# Altium footprint library 7Robot.PcbLib: 64 footprints (part 3 of 4)
Each footprint in its own frame and in the unit in brackets; x right, y up, seen from the top. Pads: shape width x height; smd on the part's side, far side on the other; paste and mask are expansions set on the pad; w line width, h text height; cw(c..) or ccw(c..) is an arc to the next point about the centre after c.
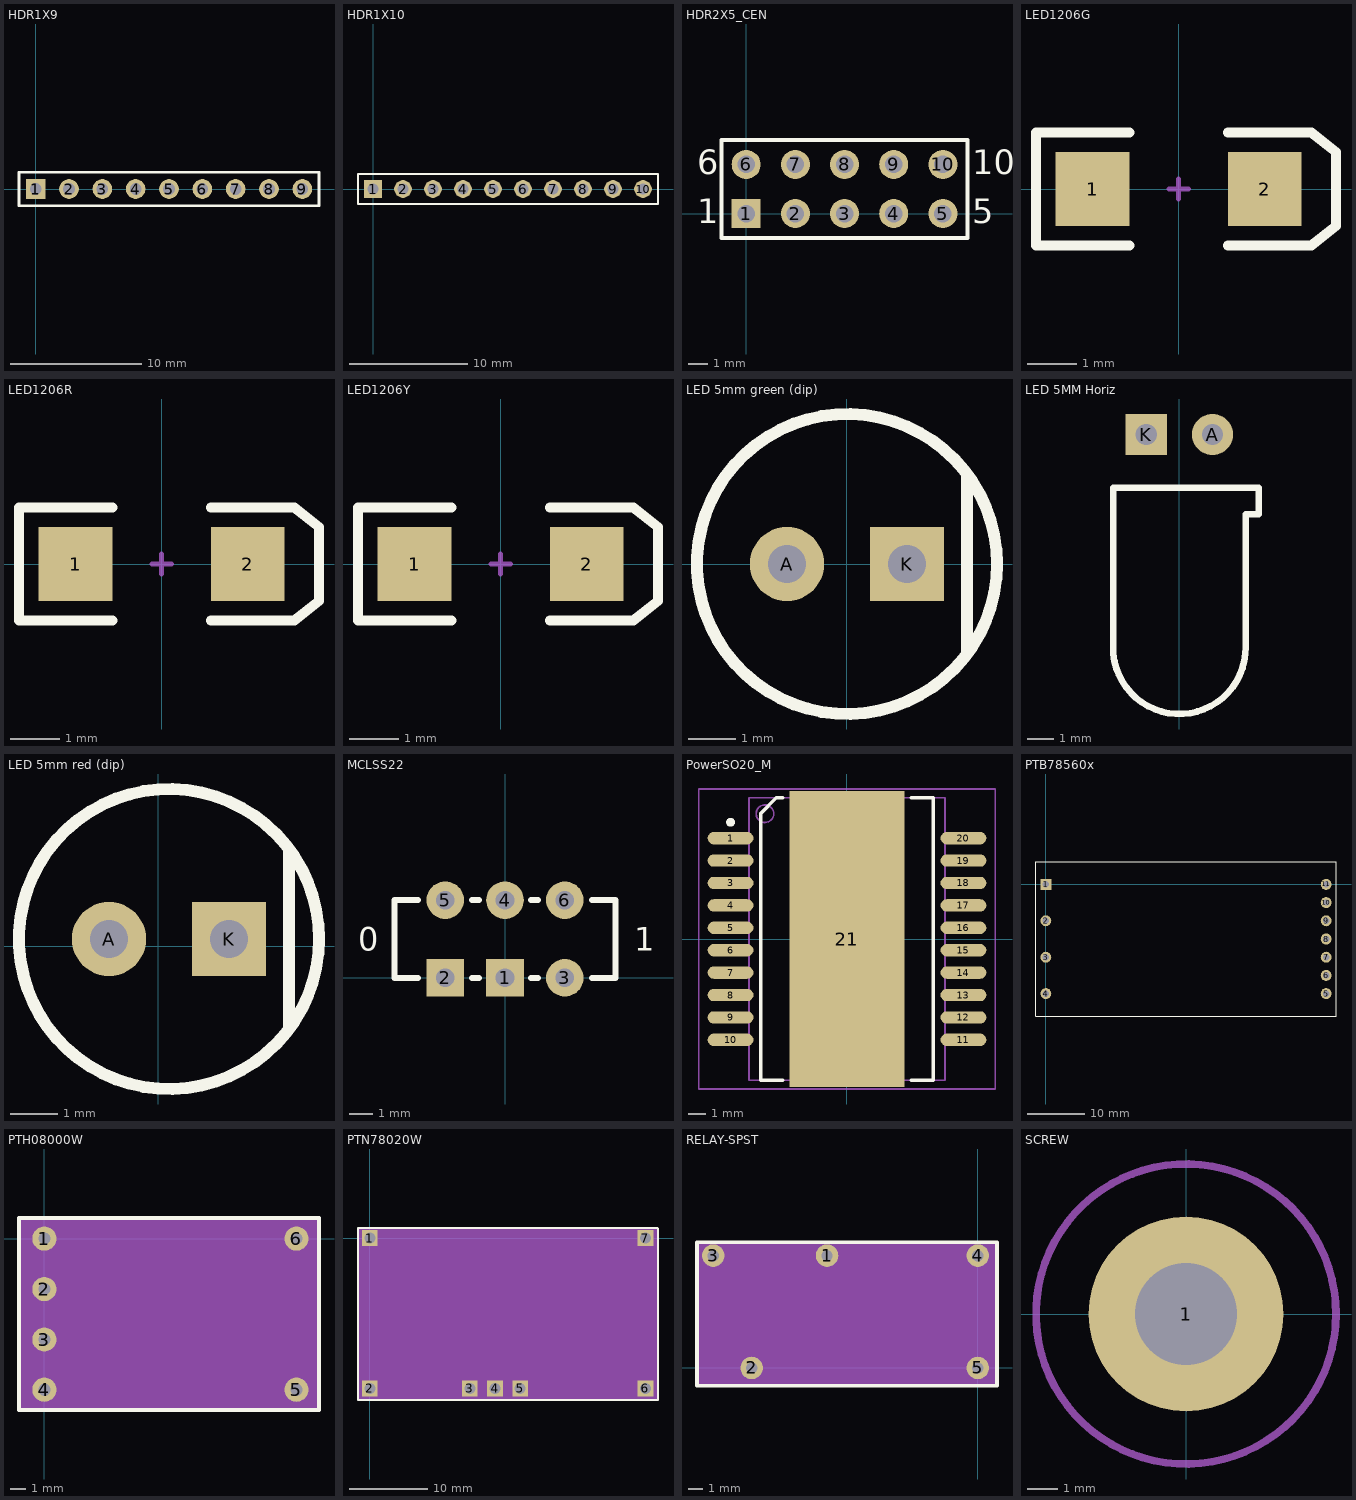
[diagram p2: the footprints below, top view; thin cyan lines are the x and y axes]

## HDR1X9 [mm] "Connector; Header; 9 Position"
pads (9):
  rect 1.5x1.5 hole 0.9: 1(0,0)
  round 1.5 hole 0.9: 2(2.54,0) 3(5.08,0) 4(7.62,0) 5(10.16,0) 6(12.7,0) 7(15.24,0) 8(17.78,0) 9(20.32,0)
Top Overlay:
  lines w0.2: -1.27,-1.27 -1.27,1.27 21.59,1.27 21.59,-1.27 -1.27,-1.27
3D body: height 8.2, standoff -3, extent -1.17,-1.246 21.69,1.253

## HDR1X10 [mm] "Connector; Header; 10 Position"
pads (10):
  rect 1.5x1.5 hole 0.9: 1(0,0)
  round 1.5 hole 0.9: 2(2.54,0) 3(5.08,0) 4(7.62,0) 5(10.16,0) 6(12.7,0) 7(15.24,0) 8(17.78,0) 9(20.32,0) 10(22.86,0)
Top Overlay:
  lines w0.2: -1.27,-1.27 24.13,-1.27 24.13,1.27 0.635,1.27 -1.27,1.27 -1.27,-1.27
3D body: height 8.2, standoff -3, extent -1.17,-1.246 24.23,1.253

## HDR2X5_CEN [mm] "Connector; Header; 5x2 Position"
pads (10):
  rect 1.5x1.5 hole 0.9: 1(0,0)
  round 1.5 hole 0.9: 2(2.54,0) 3(5.08,0) 4(7.62,0) 5(10.16,0) 6(0,2.54) 7(2.54,2.54) 8(5.08,2.54) 9(7.62,2.54) 10(10.16,2.54)
Top Overlay:
  lines w0.2: -1.27,-1.27 11.43,-1.27 11.43,3.81 -1.27,3.81 -1.27,-1.27
  text "1" at -2.54,-0.508 h1.27
  text "5" at 11.684,-0.508 h1.27
  text "10" at 11.684,2.032 h1.27
  text "6" at -2.54,2.032 h1.27
3D body: height 2.2, standoff -9.9, extent -5.15,-3.3 15.35,6

## LED1206G [mm] "SMT LED; 2 Flat Leads; 3.2X1.6X1.1"
height 1.2
pads (2):
  rect 1.5x1.5 smd: 1(-1.75,0) 2(1.75,0)
Top Overlay:
  lines w0.2: -1,-1.15 -2.9,-1.15 -2.9,1.15 -1,1.15 ; 1,-1.15 2.7,-1.15 3.2,-0.75 3.2,0.75 2.7,1.15 1,1.15
Mechanical 1:
  lines w0.1: -0.2,0 0.2,0 ; 0,-0.2 0,0.2
3D body: height 1.11, standoff -0.4, extent -1.6,-0.8 1.6,0.8

## LED1206R [mm] "SMT LED; 2 Flat Leads; 3.2X1.6X1.1"
height 1.2
pads (2):
  rect 1.5x1.5 smd: 1(-1.75,0) 2(1.75,0)
Top Overlay:
  lines w0.2: -1,-1.15 -2.9,-1.15 -2.9,1.15 -1,1.15 ; 1,-1.15 2.7,-1.15 3.2,-0.75 3.2,0.75 2.7,1.15 1,1.15
Mechanical 1:
  lines w0.1: -0.2,0 0.2,0 ; 0,-0.2 0,0.2
3D body: height 1.11, standoff -0.4, extent -1.6,-0.8 1.6,0.8

## LED1206Y [mm] "SMT LED; 2 Flat Leads; 3.2X1.6X1.1"
height 1.2
pads (2):
  rect 1.5x1.5 smd: 1(-1.75,0) 2(1.75,0)
Top Overlay:
  lines w0.2: -1,-1.15 -2.9,-1.15 -2.9,1.15 -1,1.15 ; 1,-1.15 2.7,-1.15 3.2,-0.75 3.2,0.75 2.7,1.15 1,1.15
Mechanical 1:
  lines w0.1: -0.2,0 0.2,0 ; 0,-0.2 0,0.2
3D body: height 1.11, standoff -0.4, extent -1.6,-0.8 1.6,0.8

## LED 5mm green (dip) [mil] "LED 5mm green (dip) straight"
pads (2):
  round 62 hole 32: A(-50,0)
  rect 62x62 hole 32: K(50,0)
Top Overlay:
  circle w10: c0,0 r125
  lines w10: 100,-75 100,75
3D body: height 925.2, standoff -492.13, extent -112.2,-114.17 116.14,114.17

## LED 5MM Horiz [mil] "LED 5mm Right Angle"
height 196.85
pads (2):
  round 62 hole 32: A(50,-1144.8)
  rect 62x62 hole 32: K(-50,-1144.8)
Top Overlay:
  lines w10: -99.97,-1464.8 ccw(c0.01,-1466.39) 100,-1464.8 100,-1264.8 120,-1264.8 120,-1224.8 -99.97,-1224.8 -99.97,-1464.8
3D body: height 232.28, standoff -98.43, extent -98.42,-1567.32 114.18,-1136.21

## LED 5mm red (dip) [mil] "LED 5mm red (dip) straight"
pads (2):
  round 62 hole 32: A(-40.94,5.91)
  rect 62x62 hole 32: K(59.06,5.91)
Top Overlay:
  circle w10: c9.06,5.91 r125
  lines w10: 109.06,-69.09 109.06,80.91
3D body: height 925.2, standoff -492.13, extent -104.33,-106.3 124.02,122.05

## MCLSS22 [mm] "Slide Switch DPDT"
height 8.5
pads (6):
  rect 1.6x1.6 hole 0.8: 1(0,0) 2(-2.54,0)
  round 1.6 hole 0.8: 3(2.54,0) 4(0,3.3) 5(-2.54,3.3) 6(2.54,3.3)
Top Overlay:
  lines w0.254: -3.7,0 -4.7,0 -4.7,3.3 -3.7,3.3 ; -1.4,0 -1.1,0 ; -1.4,3.3 -1.1,3.3 ; 1.1,0 1.4,0 ; 1.1,3.3 1.4,3.3 ; 3.7,0 4.7,0 4.7,3.3 3.7,3.3
  text "0" at -6.25,1.15 h1
  text "1" at 5.5,1.15 h1
3D body: height 3.15, standoff 1.65, extent 0.5,-2 2,0
3D body: height 3.5, standoff 0, extent -4.7,0 4.7,3.3

## PowerSO20_M [mm] "SOP, 20-Leads, Body 15.9x11mm, Pitch 1.27mm, IPC Low Density"
height 3.6
pads (21):
  oval 2.6x0.7 smd: 1(-6.6,5.715) 2(-6.6,4.445) 3(-6.6,3.175) 4(-6.6,1.905) 5(-6.6,0.635) 6(-6.6,-0.635) 7(-6.6,-1.905) 8(-6.6,-3.175) 9(-6.6,-4.445) 10(-6.6,-5.715) 11(6.6,-5.715) 12(6.6,-4.445) 13(6.6,-3.175) 14(6.6,-1.905) 15(6.6,-0.635) 16(6.6,0.635) 17(6.6,1.905) 18(6.6,3.175) 19(6.6,4.445) 20(6.6,5.715)
  rect 6.5x16.8 smd: 21(0,0)
Top Overlay:
  circle w0.25: c-6.6,6.615 r0.125
  lines w0.2: -3.65,-8 -4.9,-8 -4.9,7.1 -4,8 -3.65,8 ; 3.65,-8 4.9,-8 4.9,8 3.65,8
Mechanical 13:
  circle w0.1: c-4.65,7.1 r0.5
  lines w0.1: -5.55,-8 5.55,-8 5.55,8 -5.55,8 -5.55,-8
Mechanical 15:
  lines w0.1: -0.5,0 0.5,0 ; 0,-0.5 0,0.5 ; -8.4,-8.5 8.4,-8.5 8.4,8.5 -8.4,8.5 -8.4,-8.5
3D body: height 3.6, standoff 0, extent -7.2,-8 7.2,8

## PTB78560x [mm] "PTB78560x Texas Instruments Regulator"
height 10
pads (11):
  rect 1.905x1.905 hole 1.1: 1(0,0)
  round 1.905 hole 1.1: 2(0,-6.35) 3(0,-12.7) 4(0,-19.05) 5(48.895,-19.05) 6(48.895,-15.875) 7(48.895,-12.7) 8(48.895,-9.525) 9(48.895,-6.35) 10(48.895,-3.175) 11(48.895,0)
Top Overlay:
  lines w0.2: -1.714,-22.987 -1.714,3.937 50.609,3.937 50.609,-22.987 -1.714,-22.987
3D body: height 2, standoff 0, extent -1.714,-22.987 50.609,3.937
3D body: height 10, standoff 2, extent 11.25,-21.25 27.5,-6.25

## PTH08000W [mil]
height 196.85
pads (6):
  round 60 hole 30: 1(0,0) 2(0,-125.2) 3(0,-250.39) 4(0,-374.8) 5(625.2,-374.8) 6(625.2,0)
Top Overlay:
  lines w10: -62.99,-425.2 681.1,-425.2 681.1,51.18 -62.99,51.18 -62.99,-425.2
Mechanical 1:
  rectangle: -62.99,-425.2 681.1,51.18

## PTN78020W [mm]
height 9
pads (7):
  rect 2x2 hole 1.4: 1(0,0) 2(0,-19.1) 3(12.7,-19.1) 4(15.9,-19.1) 5(19.1,-19.1) 6(35,-19.1) 7(35,0)
Top Overlay:
  lines w0.254: -1.5,-20.6 36.6,-20.6 36.6,1.2 36.5,1.3 -1.5,1.3 -1.5,0.1 -1.5,-20.6
Mechanical 1:
  rectangle: -1.5,-20.6 36.6,1.3

## RELAY-SPST [mil]
height 590.55
pads (5):
  round 60 hole 30: 1(-401.57,299.21) 2(-602.36,0) 3(-704.72,299.21) 4(0,299.21) 5(0,0)
Top Overlay:
  lines w10: -748.03,-47.24 51.18,-47.24 51.18,334.65 -748.03,334.65 -748.03,-47.24
Mechanical 1:
  rectangle: -748.03,-47.24 51.18,334.65

## SCREW [mm] "Mounting Hole M3"
height 10
pads (1):
  round 6.5 hole 3.4: 1(0,0)
Mechanical 1:
  circle w0.254: c0,0 r5
3D body: height -0.8, standoff -3.8, extent -2.886,-2.523 2.886,2.524
3D body: height 10, standoff -8.18, extent -2.886,-2.523 2.887,2.524